# Altium footprint library vertigo.PcbLib: 115 footprints (part 3 of 8)
Each footprint in its own frame and in the unit in brackets; x right, y up, seen from the top. Pads: shape width x height; smd on the part's side, far side on the other; paste and mask are expansions set on the pad; w line width, h text height; cw(c..) or ccw(c..) is an arc to the next point about the centre after c.
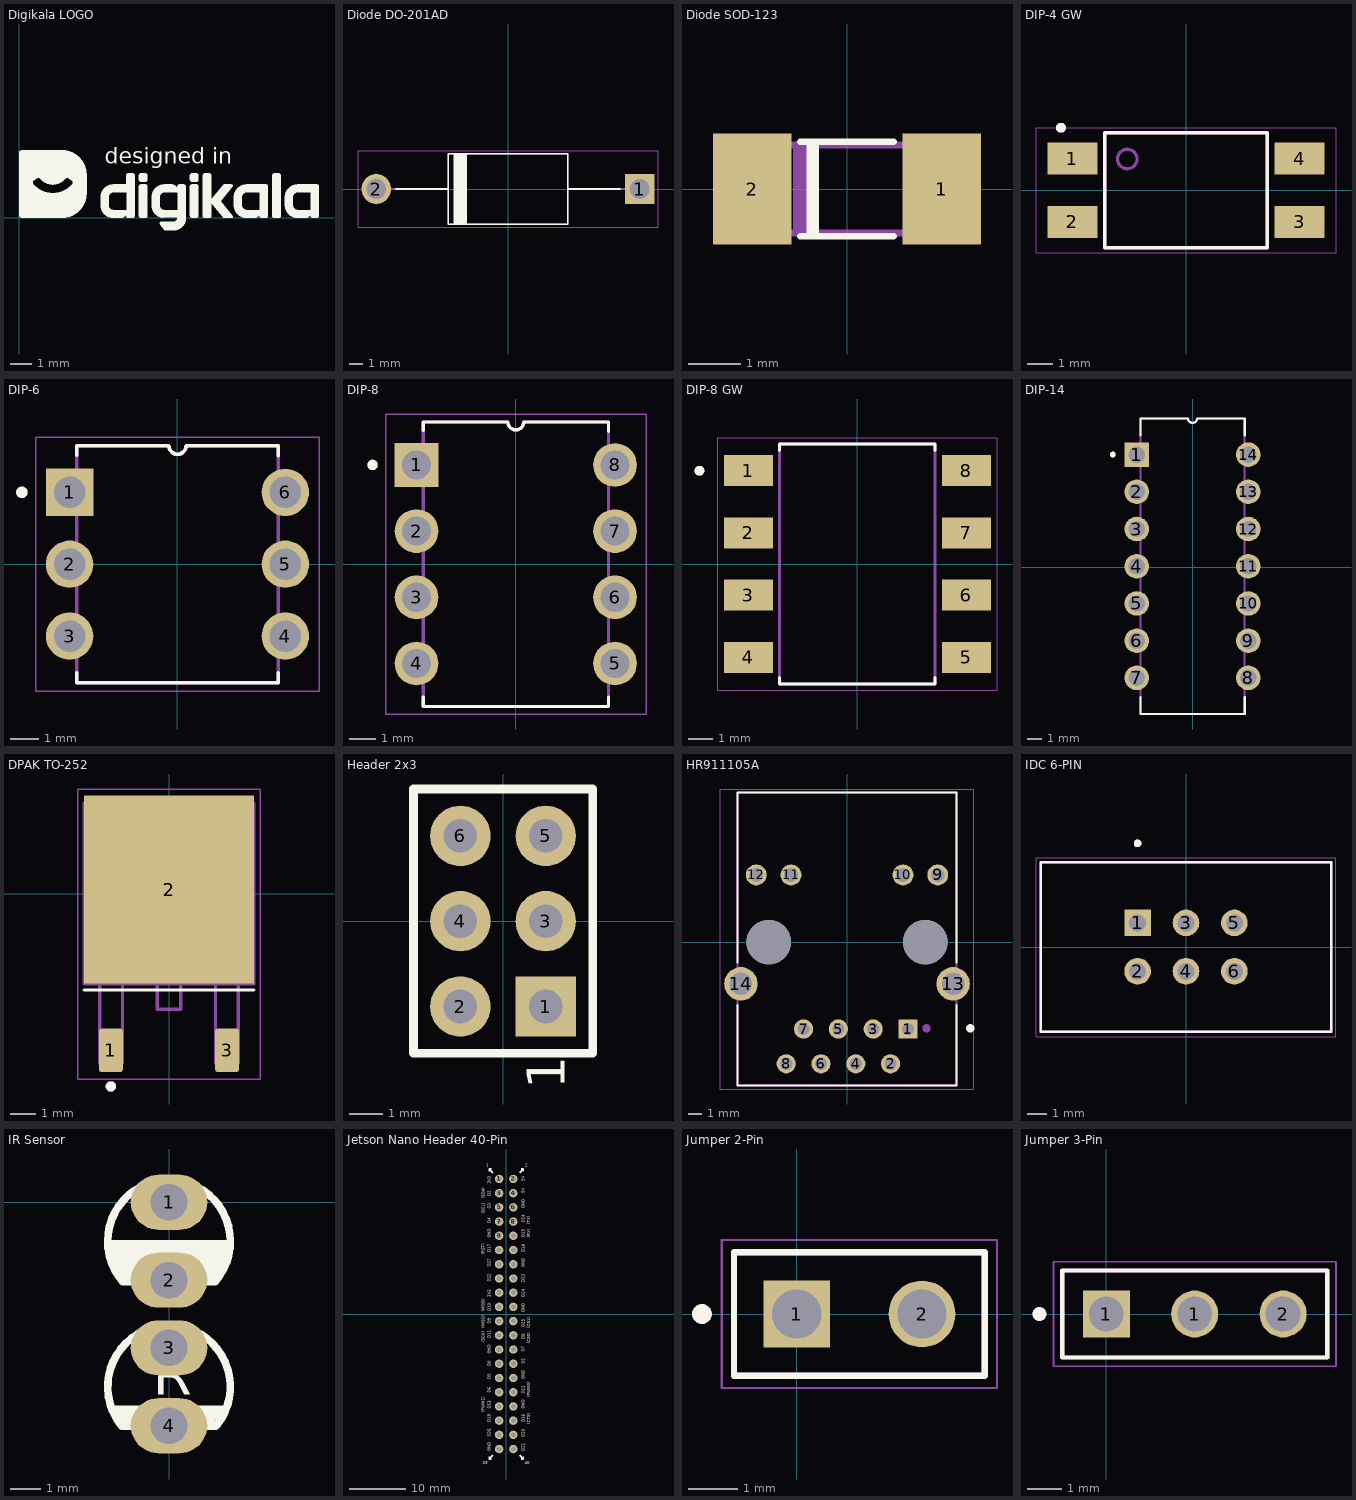
[diagram p2: the footprints below, top view; thin cyan lines are the x and y axes]

## Digikala LOGO [mm]
Top Overlay:
  drawing of 11 lines, arcs and shapes, not listed
  text "designed in" at 4.051,2.542 h0.76

## Diode DO-201AD [mm] "DO-201AD Package"
pads (2):
  rect 2.25x2.25 hole 1.5: 1(9.95,0)
  round 2.25 hole 1.5: 2(-9.95,0)
Top Overlay:
  rectangle: -4.064,-2.65 -3.175,2.65
  lines w0.127: -8.47,0 -4.5,0 ; -4.064,-2.65 -4.064,0 -4.064,2.65 ; -3.175,-2.65 -3.175,0 -3.175,2.65 ; 8.47,0 4.5,0 ; -4.5,0 -4.5,2.65 4.5,2.65 4.5,0 ; -4.5,0 -4.5,-2.65 4.5,-2.65 4.5,0
Mechanical 13:
  lines w0.127: -9.95,0 -4.5,0 ; 9.95,0 4.5,0 ; -4.5,0 -4.5,2.65 4.5,2.65 4.5,0 ; -4.5,0 -4.5,-2.65 4.5,-2.65 4.5,0
Mechanical 15:
  lines w0.05: -11.325,-2.9 -11.325,2.9 11.325,2.9 11.325,-2.9 -11.325,-2.9
3D body "do-201ad.STEP": height 7.55, standoff -1.5, extent -10.55,-2.551 10.55,2.551

## Diode SOD-123 [mm] "SOD-123 Package"
pads (2):
  rect 1.5x2.1 smd: 1(1.8,0) 2(-1.8,0)
Top Overlay:
  region: -0.536,-0.9 -0.762,-0.9 -0.762,0.9 -0.536,0.9
  lines w0.127: -0.889,-0.9 0.889,-0.9 ; -0.889,0.9 0.889,0.9
Mechanical 13:
  region: -1.587,-0.9 -1.95,-0.9 -1.95,0.9 -1.587,0.9
  region: 1.95,-0.9 1.587,-0.9 1.587,0.9 1.95,0.9
  region: -0.663,-0.9 -1.025,-0.9 -1.025,0.9 -0.663,0.9
  lines w0.127: -1.873,-0.835 1.873,-0.835 ; -1.873,0.835 1.873,0.835 -1.873,0.835
3D body "step_temp.STEP": height 1.44, standoff -0.01, extent -1.85,-0.775 1.85,0.775

## DIP-4 GW [mm] "Lead Bending Type"
pads (4):
  rect 2x1.27 smd: 1(-4.54,1.27) 2(-4.54,-1.27) 3(4.54,-1.27) 4(4.54,1.27)
Top Overlay:
  circle w0.2: c-5,2.5 r0.1
  lines w0.127: -3.25,-2.3 -3.25,2.3 3.25,2.3 3.25,-2.3 -3.25,-2.3
Mechanical 13:
  circle w0.127: c-2.35,1.25 r0.391
  lines w0.127: -3.25,-2.3 -3.25,2.3 3.25,2.3 3.25,-2.3 -3.25,-2.3
Mechanical 15:
  lines w0.05: -6,-2.5 -6,2.5 6,2.5 6,-2.5 -6,-2.5
3D body "FOD8143SD.STEP": height 3.85, standoff 0, extent -5.08,-2.3 5.08,2.3

## DIP-6 [mil] "DIP-6 Package"
pads (6):
  rect 66x66 hole 44: 1(-150,100)
  round 66 hole 44: 2(-150,0) 3(-150,-100) 4(150,-100) 5(150,0) 6(150,100)
Top Overlay:
  circle w7.87: c-216.54,100 r3.94
  lines w5: -140,-151 -140,-165 140,-165 140,-151 ; -140,152 -140,165 -12,165 ccw(c0,165) 12,165 140,165 140,151
Mechanical 13:
  circle w7.87: c-216.54,100 r3.94
  lines w5: -140,-165 -140,165 -12,165 ccw(c0,165) 12,165 140,165 140,-165 -140,-165
Mechanical 15:
  lines w1.97: -196.85,-176.38 -196.85,176.38 196.85,176.38 196.85,-176.38 -196.85,-176.38
3D body "DIP6.STEP": height 185.04, standoff -102.36, extent -154.92,-142.91 154.92,142.91

## DIP-8 [mil] "DIP-8 Package"
pads (8):
  rect 66x66 hole 44: 1(-150,150)
  round 66 hole 44: 2(-150,50) 3(-150,-50) 4(-150,-150) 5(150,-150) 6(150,-50) 7(150,50) 8(150,150)
Top Overlay:
  circle w7.87: c-216.54,150 r3.94
  lines w5: -140,-201 -140,-215 140,-215 140,-201 ; -140,202 -140,215 -12,215 ccw(c0,215) 12,215 140,215 140,201
Mechanical 13:
  circle w7.87: c-216.54,150 r3.94
  lines w5: -140,-215 140,-215 140,215 12,215 cw(c0,215) -12,215 -140,215 -140,-215
Mechanical 15:
  lines w1.97: -196.85,-226.38 196.85,-226.38 196.85,226.38 -196.85,226.38 -196.85,-226.38
3D body "IR2104PBF.STEP": height 210, standoff -160, extent -155.75,-194.5 155.75,194.5

## DIP-8 GW [mm] "Lead Bending Type"
pads (8):
  rect 2x1.27 smd: 1(-4.45,3.81) 2(-4.45,1.27) 3(-4.45,-1.27) 4(-4.45,-3.81) 5(4.45,-3.81) 6(4.45,-1.27) 7(4.45,1.27) 8(4.45,3.81)
Top Overlay:
  circle w0.2: c-6.45,3.81 r0.1
  lines w0.127: -3.175,-4.638 -3.175,-4.9 3.175,-4.9 3.175,-4.638 ; -3.175,4.638 -3.175,4.9 3.175,4.9 3.175,4.638
Mechanical 13:
  circle w0.2: c-6.45,3.81 r0.1
  lines w0.127: -3.175,-4.9 3.175,-4.9 3.175,4.9 -3.175,4.9 -3.175,-4.9
Mechanical 15:
  lines w0.05: -5.7,-5.15 5.7,-5.15 5.7,5.15 -5.7,5.15 -5.7,-5.15
3D body "step_temp.STEP": height 4.45, standoff 0, extent -4.825,-4.825 4.825,4.825

## DIP-14 [mil] "DIP-14 Package"
pads (14):
  rect 66x66 hole 44: 1(-150,303)
  round 66 hole 44: 2(-150,203) 3(-150,103) 4(-150,3) 5(-150,-97) 6(-150,-197) 7(-150,-297) 8(150,-297) 9(150,-197) 10(150,-97) 11(150,3) 12(150,103) 13(150,203) 14(150,303)
Top Overlay:
  circle w7.87: c-214.17,303 r3.94
  lines w6: -140,-348 -140,-394 140,-394 140,-348 ; -140,355 -140,400 -12,400 ccw(c0,400) 12,400 140,400 140,354
Mechanical 13:
  circle w7.87: c-214.17,303 r3.94
  lines w5: -140,-394 140,-394 140,400 12,400 cw(c0,400) -12,400 -140,400 -140,-394
3D body "IR2113.STEP": height 210, standoff -160, extent -155.75,-380 155.75,380

## DPAK TO-252 [mil] "TO-252 Package"
pads (3):
  rrect25% 37x67 smd: 1(-89,-240) 3(89,-240)
  rect 260x288 smd: 2(0,6)
Top Overlay:
  circle w7.87: c-89,-295.28 r3.94
  lines w5: -129.92,-147.64 129.92,-147.64
Mechanical 13:
  circle w7.87: c-89,-295.28 r3.94
  lines w5: -18,-138 -18,-177 18,-177 18,-138 ; -130,-138 130,-138 130,138 -130,138 -130,-138 ; -106,-260 -106,-138 -71,-138 -71,-260 -106,-260 ; 71,-260 71,-138 106,-138 106,-260 71,-260
Mechanical 15:
  lines w1.97: -140,-284 140,-284 140,160 -140,160 -140,-284
3D body "LF33CDT-TRY.STEP": height 94.49, standoff -9.06, extent -128.74,-245.62 128.74,143.15

## Header 2x3 [mm] "Connector Header 2x3"
pads (6):
  rect 1.8x1.8 hole 1: 1(1.27,-2.54)
  round 1.8 hole 1: 2(-1.27,-2.54) 3(1.27,0) 4(-1.27,0) 5(1.27,2.54) 6(-1.27,2.54)
Top Overlay:
  lines w0.254: -2.667,-3.937 2.667,-3.937 2.667,3.937 -2.667,3.937 -2.667,-3.937
  text "1" at 1.833,-4.996 h1.13
3D body "MTSW-101-07-G-S-180.stp": height 7.11, standoff -3.81, extent 0,-3.81 2.54,-1.27
3D body "MTSW-101-07-G-S-180.stp": height 7.11, standoff -3.81, extent 0,-1.27 2.54,1.27
3D body "MTSW-101-07-G-S-180.stp": height 7.11, standoff -3.81, extent 0,1.27 2.54,3.81
3D body "MTSW-101-07-G-S-180.stp": height 7.11, standoff -3.81, extent -2.54,1.27 0,3.81
3D body "MTSW-101-07-G-S-180.stp": height 7.11, standoff -3.81, extent -2.54,-1.27 0,1.27
3D body "MTSW-101-07-G-S-180.stp": height 7.11, standoff -3.81, extent -2.54,-3.81 0,-1.27

## HR911105A [mm] "Single Port RJ45 Connector"
pads (16):
  rect 1.398x1.398 hole 0.89: 1(4.45,-6.35)
  round 1.398 hole 0.89: 2(3.18,-8.89) 3(1.91,-6.35) 4(0.64,-8.89) 5(-0.63,-6.35) 6(-1.9,-8.89) 7(-3.17,-6.35) 8(-4.44,-8.89)
  round 1.53 hole 1.02: 9(6.625,4.9) 10(4.085,4.9) 11(-4.085,4.9) 12(-6.625,4.9)
  round 2.445 hole 1.63: 13(7.745,-3.05) 14(-7.745,-3.05)
  round 3.25 hole 3.25 unplated: ""(-5.715,0) ""(5.715,0)
Top Overlay:
  circle w0.3: c9,-6.3 r0.15
  lines w0.127: -8,-4.6 -8,-10.48 8,-10.48 8,-4.6 ; -8,-1.5 -8,10.92 8,10.92 8,-1.5
Mechanical 13:
  circle w0.3: c5.8,-6.3 r0.15
  lines w0.127: -8,-10.48 -8,10.92 8,10.92 8,-10.48 -8,-10.48
Mechanical 15:
  lines w0.05: -9.25,-10.73 -9.25,11.17 9.25,11.17 9.25,-10.73 -9.25,-10.73
3D body "HR911105A--3DModel-STEP-56544.STEP": height 13.5, standoff -3.05, extent -8.02,-10.38 8.02,10.92

## IDC 6-PIN [mm] "2x3 IDC Connector"
pads (6):
  rect 1.398x1.398 hole 0.89: 1(-2.54,1.27)
  round 1.398 hole 0.89: 2(-2.54,-1.27) 3(0,1.27) 4(0,-1.27) 5(2.54,1.27) 6(2.54,-1.27)
Top Overlay:
  circle w0.2: c-2.54,5.445 r0.1
  lines w0.127: -7.62,-4.445 -7.62,4.445 7.62,4.445 7.62,-4.445 -7.62,-4.445
Mechanical 13:
  circle w0.2: c-2.54,5.445 r0.1
  lines w0.127: -7.62,-4.445 -7.62,4.445 7.62,4.445 7.62,-4.445 -7.62,-4.445
Mechanical 15:
  lines w0.05: -7.87,-4.695 7.87,-4.695 7.87,4.695 -7.87,4.695 -7.87,-4.695
3D body "2-1761679-1.stp": height 9, standoff -4.41, extent -7.62,-4.775 7.62,4.445

## IR Sensor [mm]
pads (4):
  oval 2.5x1.8 hole 1.2 paste+0 mask+0.102: 1(0,0) 2(0,-2.54) 3(0,-4.75) 4(0,-7.29)
Top Overlay:
  rectangle: 1.374,-2.428 1.74,-1.984
  rectangle: -1.73,-2.441 -1.412,-1.943
  rectangle: -1.48,-2.59 1.498,-2.009
  rectangle: -1.95,-2.037 1.915,-1.33
  region: -1.78,-6.632 -1.78,-7.089 -1.587,-7.089 -1.587,-6.632
  region: -1.945,-6.632 -1.945,-6.81 -1.78,-6.81 -1.78,-6.632
  region: 1.717,-6.632 1.717,-6.81 1.882,-6.81 1.882,-6.632
  region: 1.523,-6.632 1.523,-7.089 1.717,-7.089 1.717,-6.632
  region: -1.587,-6.632 -1.587,-7.303 1.523,-7.303 1.523,-6.632
  lines w0.2: -1.95,-1.33 1.97,-1.33
  lines w0.25: -1.534,-7.303 1.523,-7.303
  lines w0.254: -1.587,-7.238 cw(c0,-6.02) 1.572,-7.256 ; -1.508,-2.584 cw(c0,-1.27) 1.513,-2.579 ; -1.48,-2.59 1.498,-2.59
  text "R" at -0.533,-6.716 h2.3
3D body "IR 3 sender.STEP": height 5.18, standoff -2.82, extent -2,-3.046 2,0.672
3D body "IR 3 rec.STEP": height 5.18, standoff -2.82, extent -1.999,-7.796 1.999,-4.078

## Jetson Nano Header 40-Pin [mm] "Jetson Nano Header Pinout"
pads (40):
  round 1.5 hole 0.9: 1(-1.27,24.13) 2(1.27,24.13) 3(-1.27,21.59) 4(1.27,21.59) 5(-1.27,19.05) 6(1.27,19.05) 7(-1.27,16.51) 8(1.27,16.51) 9(-1.27,13.97) 10(1.27,13.97) 11(-1.27,11.43) 12(1.27,11.43) 13(-1.27,8.89) 14(1.27,8.89) 15(-1.27,6.35) 16(1.27,6.35) 17(-1.27,3.81) 18(1.27,3.81) 19(-1.27,1.27) 20(1.27,1.27) 21(-1.27,-1.27) 22(1.27,-1.27) 23(-1.27,-3.81) 24(1.27,-3.81) 25(-1.27,-6.35) 26(1.27,-6.35) 27(-1.27,-8.89) 28(1.27,-8.89) 29(-1.27,-11.43) 30(1.27,-11.43) 31(-1.27,-13.97) 32(1.27,-13.97) 33(-1.27,-16.51) 34(1.27,-16.51) 35(-1.27,-19.05) 36(1.27,-19.05) 37(-1.27,-21.59) 38(1.27,-21.59) 39(-1.27,-24.13) 40(1.27,-24.13)
Top Overlay:
  lines w0.254: -3.048,-25.527 -3.048,-25.908 ; -3.048,25.527 -3.048,25.908 ; -2.667,-25.908 -3.048,-25.908 ; -2.667,25.908 -3.048,25.908 ; -2.413,-25.273 -3.048,-25.908 ; -2.413,25.273 -3.048,25.908 ; 2.413,-25.273 3.048,-25.908 ; 2.413,25.273 3.048,25.908 ; 2.667,-25.908 3.048,-25.908 ; 2.667,25.908 3.048,25.908 ; 3.048,-25.527 3.048,-25.908 ; 3.048,25.527 3.048,25.908
  text "(RX)" at 4.318,13.589 h0.51
  text "(CS1)" at 4.318,-2.54 h0.51
  text "(SCL)" at -3.81,17.907 h0.51
  text "(SCK)" at -3.81,-5.08 h0.51
  text "(MISO)" at -3.81,-2.54 h0.51
  text "(MOSI)" at -3.81,0.381 h0.51
  text "(SDA)" at -3.81,20.574 h0.51
  text "D4" at -2.794,16.256 h0.51
  text "D22" at -2.794,5.728 h0.51
  text "GND" at -2.794,-24.511 h0.51
  text "D26" at -2.794,-21.971 h0.51
  text "D19" at -2.794,-19.304 h0.51
  text "D13" at -2.794,-16.891 h0.51
  text "D6" at -2.794,-14.097 h0.51
  text "D5" at -2.794,-11.684 h0.51
  text "D0" at -2.794,-9.307 h0.51
  text "GND" at -2.794,-7.083 h0.51
  text "D11" at -2.794,-4.351 h0.51
  text "D9" at -2.794,-1.778 h0.51
  text "D10" at -2.794,0.508 h0.51
  text "3V3" at -2.794,2.997 h0.51
  text "D27" at -2.794,8.46 h0.51
  text "D17" at -2.794,11.049 h0.51
  text "GND" at -2.794,13.589 h0.51
  text "3V3" at -2.794,23.241 h0.51
  text "D3" at -2.794,18.794 h0.51
  text "D2" at -2.794,21.017 h0.51
  text "D21" at 3.302,-24.511 h0.51
  text "D20" at 3.302,-21.993 h0.51
  text "D16" at 3.302,-19.306 h0.51
  text "GND" at 3.302,-16.891 h0.51
  text "D12" at 3.302,-14.224 h0.51
  text "GND" at 3.302,-11.684 h0.51
  text "D1" at 3.302,-8.89 h0.51
  text "D7" at 3.302,-6.718 h0.51
  text "D25" at 3.302,-2.359 h0.51
  text "GND" at 3.302,0.328 h0.51
  text "D24" at 3.302,3.015 h0.51
  text "D23" at 3.302,5.702 h0.51
  text "GND" at 3.302,8.389 h0.51
  text "D18" at 3.302,11.076 h0.51
  text "D15" at 3.302,13.678 h0.51
  text "D14" at 3.302,16.28 h0.51
  text "5V" at 3.302,23.749 h0.51
  text "GND" at 3.302,18.883 h0.51
  text "5V" at 3.302,21.57 h0.51
  text "1" at -3.556,26.289 h0.51
  text "2" at 3.429,26.289 h0.51
  text "40" at 3.302,-26.797 h0.51
  text "39" at -4.191,-26.797 h0.51
  text "(TX)" at 4.318,16.002 h0.51
  text "D8" at 3.302,-4.539 h0.51
  text "(CS0)" at 4.318,-5.334 h0.51
  text "(CTS)" at 4.318,-19.685 h0.51
  text "(RST)" at -3.81,10.541 h0.51
  text "(PWM0)" at 4.318,-14.859 h0.51
  text "(PWM1)" at -3.81,-17.526 h0.51
3D body "2x20 Stacking Header.step": height 5.19, standoff -9.11, extent -2.54,-25.75 2.54,25.75

## Jumper 2-Pin [mm]
pads (2):
  rect 1.35x1.35 hole 1: 1(0,0)
  round 1.35 hole 1: 2(2.54,0)
Top Overlay:
  circle w0.2: c-1.92,0 r0.1
  lines w0.127: -1.27,-1.25 3.81,-1.25 3.81,1.25 -1.27,1.25 -1.27,-1.25
Mechanical 13:
  circle w0.2: c-1.92,0 r0.1
  lines w0.127: -1.27,-1.25 3.81,-1.25 ; -1.27,-1.25 3.81,-1.25 ; -1.27,-1.25 -1.27,1.25 3.81,1.25 3.81,-1.25
Mechanical 15:
  lines w0.05: -1.52,-1.5 -1.52,1.5 4.06,1.5 4.06,-1.5 -1.52,-1.5
3D body "MTSW-101-07-G-S-180.stp": height 7.11, standoff -3.81, extent -1.27,-1.27 1.27,1.27
3D body "MTSW-101-07-G-S-180.stp": height 7.11, standoff -3.81, extent 1.27,-1.27 3.81,1.27

## Jumper 3-Pin [mm] "Jumper"
pads (3):
  rect 1.35x1.35 hole 1: 1(0,0)
  round 1.35 hole 1: 1(2.54,0) 2(5.08,0)
Top Overlay:
  circle w0.2: c-1.92,0 r0.1
  lines w0.127: -1.27,-1.25 6.35,-1.25 6.35,1.25 -1.27,1.25 -1.27,-1.25
Mechanical 13:
  circle w0.2: c-1.92,0 r0.1
  lines w0.127: -1.27,-1.25 6.35,-1.25 ; -1.27,-1.25 6.35,-1.25 ; -1.27,-1.25 -1.27,1.25 6.35,1.25 6.35,-1.25
Mechanical 15:
  lines w0.05: -1.52,-1.5 6.6,-1.5 6.6,1.5 -1.52,1.5 -1.52,-1.5
3D body "826926-3--3DModel-STEP-1.STEP": height 9.7, standoff -3, extent -1.27,-1.25 6.35,1.25